# Altium footprint library TSC Footprints.PcbLib: 99 footprints (part 1 of 7)
Each footprint in its own frame and in the unit in brackets; x right, y up, seen from the top. Pads: shape width x height; smd on the part's side, far side on the other; paste and mask are expansions set on the pad; w line width, h text height; cw(c..) or ccw(c..) is an arc to the next point about the centre after c.
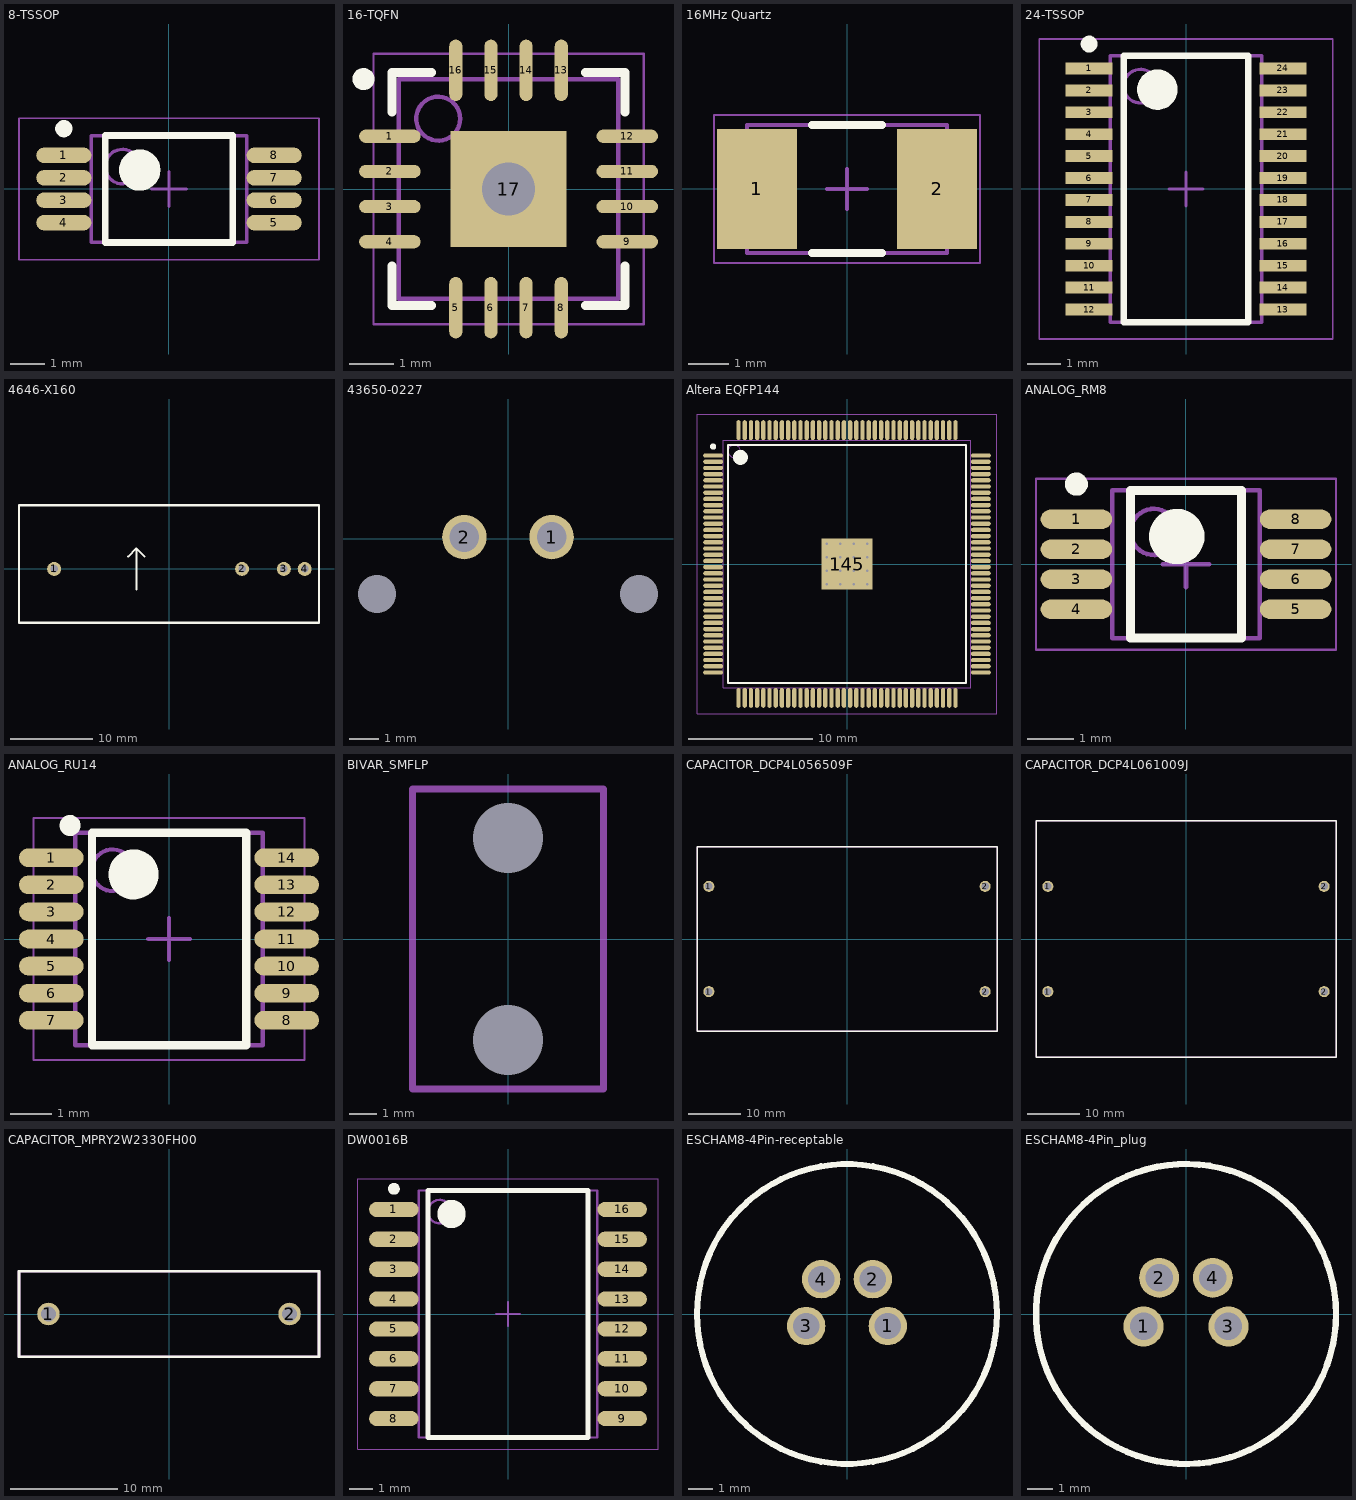
[diagram p0: the footprints below, top view; thin cyan lines are the x and y axes]

## 8-TSSOP [mm] "TSOP, 8-Leads, Body 3,00x4,40mm, Pitch 0,65mm, IPC Low Density"
height 1.2
pads (8):
  oval 1.6x0.45 smd: 1(-3.05,0.975) 2(-3.05,0.325) 3(-3.05,-0.325) 4(-3.05,-0.975) 5(3.05,-0.975) 6(3.05,-0.325) 7(3.05,0.325) 8(3.05,0.975)
Top Overlay:
  circle w0.6: c-0.85,0.55 r0.3
  circle w0.25: c-3.05,1.75 r0.125
  lines w0.2: -1.85,-1.55 1.85,-1.55 1.85,1.55 -1.85,1.55 -1.85,-1.55
Mechanical 13:
  circle w0.1: c-1.35,0.65 r0.5
  lines w0.1: -2.25,-1.55 2.25,-1.55 2.25,1.55 -2.25,1.55 -2.25,-1.55
Mechanical 15:
  lines w0.05: -4.35,-2.05 4.35,-2.05 4.35,2.05 -4.35,2.05 -4.35,-2.05
  lines w0.1: -0.5,0 0.5,0 ; 0,-0.5 0,0.5
3D body "8-TSSOP.step": height 1.2, standoff 0, extent -3.2,-1.55 3.2,1.55

## 16-TQFN [mm] "QFN, 16-Leads, Body 5,00x5,00mm, Pitch 0,80mm, Thermal Pad 2,63x2,63mm, IPC Medium Density"
height 0.8
pads (17):
  oval 1.4x0.3 smd: 1(-2.7,1.2) 2(-2.7,0.4) 3(-2.7,-0.4) 4(-2.7,-1.2) 9(2.7,-1.2) 10(2.7,-0.4) 11(2.7,0.4) 12(2.7,1.2)
  oval 0.3x1.4 smd: 5(-1.2,-2.7) 6(-0.4,-2.7) 7(0.4,-2.7) 8(1.2,-2.7) 13(1.2,2.7) 14(0.4,2.7) 15(-0.4,2.7) 16(-1.2,2.7)
  rect 2.63x2.63 smd: 17(0,0)
via 0,0 diameter 1.3 hole 1.2
Top Overlay:
  circle w0.25: c-3.3,2.5 r0.125
  lines w0.2: -2.65,-1.75 -2.65,-2.65 -1.75,-2.65 ; -2.65,1.75 -2.65,2.65 -1.75,2.65 ; 1.75,-2.65 2.65,-2.65 2.65,-1.75 ; 1.75,2.65 2.65,2.65 2.65,1.75
Mechanical 13:
  circle w0.1: c-1.6,1.6 r0.5
  lines w0.1: -2.5,-2.5 2.5,-2.5 2.5,2.5 -2.5,2.5 -2.5,-2.5
Mechanical 15:
  lines w0.05: -3.075,-3.075 3.075,-3.075 3.075,3.075 -3.075,3.075 -3.075,-3.075
  lines w0.1: -0.5,0 0.5,0 ; 0,-0.5 0,0.5
3D body "16-TQFN.step": height 0.8, standoff 0, extent -2.55,-2.55 2.55,2.55

## 16MHz Quartz [mm] "16 MHz Quartz, 5x3.2 mm, Custom HC49-SMD Package"
height 1.8
pads (2):
  rect 2x3 smd: 1(-2.25,0) 2(2.25,0)
Top Overlay:
  lines w0.2: -0.875,-1.6 0.875,-1.6 ; -0.875,1.6 0.875,1.6
Mechanical 13:
  lines w0.1: -2.5,-1.6 2.5,-1.6 2.5,1.6 -2.5,1.6 -2.5,-1.6
Mechanical 15:
  lines w0.05: -3.325,-1.85 3.325,-1.85 3.325,1.85 -3.325,1.85 -3.325,-1.85
  lines w0.1: -0.5,0 0.5,0 ; 0,-0.5 0,0.5
3D body "16MHz Quartz.step": height 1.8, standoff 0, extent -2.72,-1.6 2.72,1.6

## 24-TSSOP [mm]
height 1.1
pads (24):
  rect 1.4x0.35 smd: 1(-2.875,3.575) 2(-2.875,2.925) 3(-2.875,2.275) 4(-2.875,1.625) 5(-2.875,0.975) 6(-2.875,0.325) 7(-2.875,-0.325) 8(-2.875,-0.975) 9(-2.875,-1.625) 10(-2.875,-2.275) 11(-2.875,-2.925) 12(-2.875,-3.575) 13(2.875,-3.575) 14(2.875,-2.925) 15(2.875,-2.275) 16(2.875,-1.625) 17(2.875,-0.975) 18(2.875,-0.325) 19(2.875,0.325) 20(2.875,0.975) 21(2.875,1.625) 22(2.875,2.275) 23(2.875,2.925) 24(2.875,3.575)
Top Overlay:
  circle w0.6: c-0.85,2.95 r0.3
  circle w0.25: c-2.875,4.3 r0.125
  lines w0.2: -1.85,-3.95 1.85,-3.95 1.85,3.95 -1.85,3.95 -1.85,-3.95
Mechanical 13:
  circle w0.1: c-1.35,3.05 r0.5
  lines w0.1: -2.25,-3.95 2.25,-3.95 2.25,3.95 -2.25,3.95 -2.25,-3.95
Mechanical 15:
  lines w0.05: -4.35,-4.45 4.35,-4.45 4.35,4.45 -4.35,4.45 -4.35,-4.45
  lines w0.1: -0.5,0 0.5,0 ; 0,-0.5 0,0.5
3D body "24-TSSOP.step": height 1.1, standoff 0, extent -3.2,-3.95 3.2,3.95

## 4646-X160 [mm]
height 27.6
pads (4):
  round 1.7 hole 0.9: 1(-13.97,0) 2(8.89,0) 3(13.97,0) 4(16.51,0)
Top Overlay:
  lines w0.254: -3.97,-2.5 -3.97,2.5 ; -2.97,1.5 -3.97,2.5 ; -3.97,2.5 -4.97,1.5 -3.97,2.5 ; -18.25,-6.55 18.25,-6.55 18.25,7.75 -18.25,7.75 -18.25,-6.55
3D body "T60404-N4646-X160.stp": height 27.6, standoff -4.5, extent -18.27,-6.515 18.23,7.785

## 43650-0227 [mm]
height 9.9
pads (4):
  round 1.524 hole 1.02: 1(1.5,0.055) 2(-1.5,0.055)
  round 0 hole 1.3 unplated: ""(-4.5,-1.905) ""(4.5,-1.905)
3D body "436500227.stp": height 9.95, standoff -3.13, extent -4.825,-2.413 4.825,3.192

## Altera EQFP144 [mm] "SQFP, 144-Leads, Body 20,00x20,00mm, Pitch 0,50mm, Thermal Pad 4,15x4,15mm, IPC Low Density"
height 1.65
pads (145):
  oval 1.6x0.35 smd: 1(-10.8,8.75) 2(-10.8,8.25) 3(-10.8,7.75) 4(-10.8,7.25) 5(-10.8,6.75) 6(-10.8,6.25) 7(-10.8,5.75) 8(-10.8,5.25) 9(-10.8,4.75) 10(-10.8,4.25) 11(-10.8,3.75) 12(-10.8,3.25) 13(-10.8,2.75) 14(-10.8,2.25) 15(-10.8,1.75) 16(-10.8,1.25) 17(-10.8,0.75) 18(-10.8,0.25) 19(-10.8,-0.25) 20(-10.8,-0.75) 21(-10.8,-1.25) 22(-10.8,-1.75) 23(-10.8,-2.25) 24(-10.8,-2.75) 25(-10.8,-3.25) 26(-10.8,-3.75) 27(-10.8,-4.25) 28(-10.8,-4.75) 29(-10.8,-5.25) 30(-10.8,-5.75) 31(-10.8,-6.25) 32(-10.8,-6.75) 33(-10.8,-7.25) 34(-10.8,-7.75) 35(-10.8,-8.25) 36(-10.8,-8.75) 73(10.8,-8.75) 74(10.8,-8.25) 75(10.8,-7.75) 76(10.8,-7.25) 77(10.8,-6.75) 78(10.8,-6.25) 79(10.8,-5.75) 80(10.8,-5.25) 81(10.8,-4.75) 82(10.8,-4.25) 83(10.8,-3.75) 84(10.8,-3.25) 85(10.8,-2.75) 86(10.8,-2.25) 87(10.8,-1.75) 88(10.8,-1.25) 89(10.8,-0.75) 90(10.8,-0.25) 91(10.8,0.25) 92(10.8,0.75) 93(10.8,1.25) 94(10.8,1.75) 95(10.8,2.25) 96(10.8,2.75) 97(10.8,3.25) 98(10.8,3.75) 99(10.8,4.25) 100(10.8,4.75) 101(10.8,5.25) 102(10.8,5.75) 103(10.8,6.25) 104(10.8,6.75) 105(10.8,7.25) 106(10.8,7.75) 107(10.8,8.25) 108(10.8,8.75)
  oval 0.35x1.6 smd: 37(-8.75,-10.8) 38(-8.25,-10.8) 39(-7.75,-10.8) 40(-7.25,-10.8) 41(-6.75,-10.8) 42(-6.25,-10.8) 43(-5.75,-10.8) 44(-5.25,-10.8) 45(-4.75,-10.8) 46(-4.25,-10.8) 47(-3.75,-10.8) 48(-3.25,-10.8) 49(-2.75,-10.8) 50(-2.25,-10.8) 51(-1.75,-10.8) 52(-1.25,-10.8) 53(-0.75,-10.8) 54(-0.25,-10.8) 55(0.25,-10.8) 56(0.75,-10.8) 57(1.25,-10.8) 58(1.75,-10.8) 59(2.25,-10.8) 60(2.75,-10.8) 61(3.25,-10.8) 62(3.75,-10.8) 63(4.25,-10.8) 64(4.75,-10.8) 65(5.25,-10.8) 66(5.75,-10.8) 67(6.25,-10.8) 68(6.75,-10.8) 69(7.25,-10.8) 70(7.75,-10.8) 71(8.25,-10.8) 72(8.75,-10.8) 109(8.75,10.8) 110(8.25,10.8) 111(7.75,10.8) 112(7.25,10.8) 113(6.75,10.8) 114(6.25,10.8) 115(5.75,10.8) 116(5.25,10.8) 117(4.75,10.8) 118(4.25,10.8) 119(3.75,10.8) 120(3.25,10.8) 121(2.75,10.8) 122(2.25,10.8) 123(1.75,10.8) 124(1.25,10.8) 125(0.75,10.8) 126(0.25,10.8) 127(-0.25,10.8) 128(-0.75,10.8) 129(-1.25,10.8) 130(-1.75,10.8) 131(-2.25,10.8) 132(-2.75,10.8) 133(-3.25,10.8) 134(-3.75,10.8) 135(-4.25,10.8) 136(-4.75,10.8) 137(-5.25,10.8) 138(-5.75,10.8) 139(-6.25,10.8) 140(-6.75,10.8) 141(-7.25,10.8) 142(-7.75,10.8) 143(-8.25,10.8) 144(-8.75,10.8)
  rect 4.15x4.15 smd: 145(0,0)
via -1.65,1.65 diameter 0.5 hole 0.2
via -0.55,1.65 diameter 0.5 hole 0.2
via 0.55,1.65 diameter 0.5 hole 0.2
via 1.65,1.65 diameter 0.5 hole 0.2
via -1.65,0.55 diameter 0.5 hole 0.2
via -0.55,0.55 diameter 0.5 hole 0.2
via 0.55,0.55 diameter 0.5 hole 0.2
via 1.65,0.55 diameter 0.5 hole 0.2
via -1.65,-0.55 diameter 0.5 hole 0.2
via -0.55,-0.55 diameter 0.5 hole 0.2
via 0.55,-0.55 diameter 0.5 hole 0.2
via 1.65,-0.55 diameter 0.5 hole 0.2
via -1.65,-1.65 diameter 0.5 hole 0.2
via -0.55,-1.65 diameter 0.5 hole 0.2
via 0.55,-1.65 diameter 0.5 hole 0.2
via 1.65,-1.65 diameter 0.5 hole 0.2
Top Overlay:
  circle w0.25: c-10.8,9.475 r0.125
  circle w0.6: c-8.6,8.6 r0.3
  lines w0.2: -9.6,-9.6 -9.6,9.6 9.6,9.6 9.6,-9.6 -9.6,-9.6
Mechanical 13:
  circle w0.1: c-9.1,9.1 r0.5
  lines w0.1: -10,-10 -10,10 10,10 10,-10 -10,-10
Mechanical 15:
  lines w0.05: -12.1,-12.1 -12.1,12.1 12.1,12.1 12.1,-12.1 -12.1,-12.1
  lines w0.1: -0.5,0 0.5,0 ; 0,-0.5 0,0.5
3D body "Altera EQFP144.step": height 1.65, standoff 0, extent -11,-11 11,11

## ANALOG_RM8 [mm] "Analog Devices 8-Lead Mini Small Outline Package [MSOP]"
height 1.1
pads (8):
  oval 1.55x0.42 smd: 1(-2.375,0.975) 2(-2.375,0.325) 3(-2.375,-0.325) 4(-2.375,-0.975) 5(2.375,-0.975) 6(2.375,-0.325) 7(2.375,0.325) 8(2.375,0.975)
Top Overlay:
  circle w0.25: c-2.375,1.735 r0.125
  circle w0.6: c-0.2,0.6 r0.3
  lines w0.2: -1.2,-1.6 -1.2,1.6 1.2,1.6 1.2,-1.6 -1.2,-1.6
Mechanical 13:
  circle w0.1: c-0.7,0.7 r0.5
  lines w0.1: -1.6,-1.6 -1.6,1.6 1.6,1.6 1.6,-1.6 -1.6,-1.6
Mechanical 15:
  lines w0.05: -3.25,-1.85 -3.25,1.85 3.25,1.85 3.25,-1.85 -3.25,-1.85
  lines w0.1: -0.5,0 0.5,0 ; 0,-0.5 0,0.5
3D body "ANALOG_RM8.step": height 1.1, standoff 0, extent -2.45,-1.6 2.45,1.6

## ANALOG_RU14 [mm] "Analog Devices 14-Lead Thin Shrink Small Outline Package [TSSOP]"
height 1.2
pads (14):
  oval 1.55x0.45 smd: 1(-2.825,1.95) 2(-2.825,1.3) 3(-2.825,0.65) 4(-2.825,0) 5(-2.825,-0.65) 6(-2.825,-1.3) 7(-2.825,-1.95) 8(2.825,-1.95) 9(2.825,-1.3) 10(2.825,-0.65) 11(2.825,0) 12(2.825,0.65) 13(2.825,1.3) 14(2.825,1.95)
Top Overlay:
  circle w0.6: c-0.85,1.55 r0.3
  circle w0.25: c-2.375,2.725 r0.125
  lines w0.2: -1.85,-2.55 1.85,-2.55 1.85,2.55 -1.85,2.55 -1.85,-2.55
Mechanical 13:
  circle w0.1: c-1.35,1.65 r0.5
  lines w0.1: -2.25,-2.55 2.25,-2.55 2.25,2.55 -2.25,2.55 -2.25,-2.55
Mechanical 15:
  lines w0.05: -3.25,-2.9 3.25,-2.9 3.25,2.9 -3.25,2.9 -3.25,-2.9
  lines w0.1: -0.5,0 0.5,0 ; 0,-0.5 0,0.5
3D body "ANALOG_RU-14.step": height 1.2, standoff 0, extent -3.2,-2.55 3.2,2.55

## BIVAR_SMFLP [mm] "SMD flexible lightpipe"
height 34.3
pads (2):
  round 0 hole 2.565: ""(0,-3.7) ""(0,3.7)
Mechanical 1:
  lines w0.254: -3.5,-5.5 -3.5,5.5 3.5,5.5 3.5,-5.5 -3.5,-5.5
3D body "SMFLP_SOCKET.step": height 8.85, standoff -3.21, extent -3.492,-5.461 3.493,5.461

## CAPACITOR_DCP4L056509F [mm] "WIMA MKP4 Capacitor"
height 50
pads (4):
  round 2.1 hole 1.4: 1(-26.25,-10) 1(-26.25,10) 2(26.25,-10) 2(26.25,10)
Top Overlay:
  lines w0.254: -28.5,-17.5 28.5,-17.5 28.5,17.5 -28.5,17.5 -28.5,-17.5
Mechanical 13:
  lines w0.254: -28.5,-17.5 -28.5,17.5 28.5,17.5 28.5,-17.5 -28.5,-17.5
3D body: height 50, standoff 0, extent -28.5,-17.5 28.5,17.5

## CAPACITOR_DCP4L061009J [mm] "WIMA MKP4 Capacitor"
height 65
pads (4):
  round 2.1 hole 1.4: 1(-26.25,-10) 1(-26.25,10) 2(26.25,-10) 2(26.25,10)
Top Overlay:
  lines w0.254: -28.5,-22.5 -28.5,22.5 28.5,22.5 28.5,-22.5 -28.5,-22.5
Mechanical 13:
  lines w0.254: -28.5,-22.5 -28.5,22.5 28.5,22.5 28.5,-22.5 -28.5,-22.5
3D body: height 65, standoff 0, extent -28.5,-22.5 28.5,22.5

## CAPACITOR_MPRY2W2330FH00 [mm] "WIMA MP3-Y2 Capacitor"
height 20
pads (2):
  round 2.1 hole 1.4: 1(-11.25,0) 2(11.25,0)
Top Overlay:
  lines w0.254: -14,-4 -14,4 14,4 14,-4 -14,-4
Mechanical 13:
  lines w0.254: -14,-4 14,-4 14,4 -14,4 -14,-4
3D body: height 20, standoff 0, extent -14,-4 14,4

## DW0016B [mm]
height 2.65
pads (16):
  oval 2.1x0.65 smd: 1(-4.85,4.445) 2(-4.85,3.175) 3(-4.85,1.905) 4(-4.85,0.635) 5(-4.85,-0.635) 6(-4.85,-1.905) 7(-4.85,-3.175) 8(-4.85,-4.445) 9(4.85,-4.445) 10(4.85,-3.175) 11(4.85,-1.905) 12(4.85,-0.635) 13(4.85,0.635) 14(4.85,1.905) 15(4.85,3.175) 16(4.85,4.445)
Top Overlay:
  circle w0.6: c-2.4,4.25 r0.3
  circle w0.25: c-4.85,5.32 r0.125
  lines w0.2: -3.4,-5.25 3.4,-5.25 3.4,5.25 -3.4,5.25 -3.4,-5.25
Mechanical 13:
  circle w0.1: c-2.9,4.35 r0.5
  lines w0.1: -3.8,-5.25 3.8,-5.25 3.8,5.25 -3.8,5.25 -3.8,-5.25
Mechanical 15:
  lines w0.05: -6.375,-5.75 6.375,-5.75 6.375,5.75 -6.375,5.75 -6.375,-5.75
  lines w0.1: -0.5,0 0.5,0 ; 0,-0.5 0,0.5
3D body "DW0016B.step": height 2.65, standoff 0, extent -5.15,-5.25 5.15,5.25

## ESCHAM8-4Pin-receptable [mm]
height 18.8
pads (4):
  round 1.6 hole 1.1: 1(1.7,-0.5) 2(1.075,1.45) 3(-1.7,-0.5) 4(-1.075,1.45)
Top Overlay:
  circle w0.254: c0,0 r6.25
3D body: height 0, standoff 0, extent -5.999,-5.999 5.999,5.999
3D body "AL-FHM8KUA4P_M10.stp": height 2, standoff -16.8, extent -6,-6.25 6,6.25

## ESCHAM8-4Pin_plug [mm]
height 17.9
pads (4):
  round 1.6 hole 1.1: 1(-1.7,-0.5) 2(-1.075,1.45) 3(1.7,-0.5) 4(1.075,1.45)
Top Overlay:
  circle w0.254: c0,0 r6
3D body: height 0, standoff 0, extent -5.999,-5.999 5.999,5.999
3D body "AL-FHM8SUA4P_M8.stp": height 17.9, standoff -3, extent -6,-6.25 6,6.25